# Altium integrated library Wurth Electronik Pin Headers 6130xx21121.IntLib: 130 symbols (part 2 of 2)
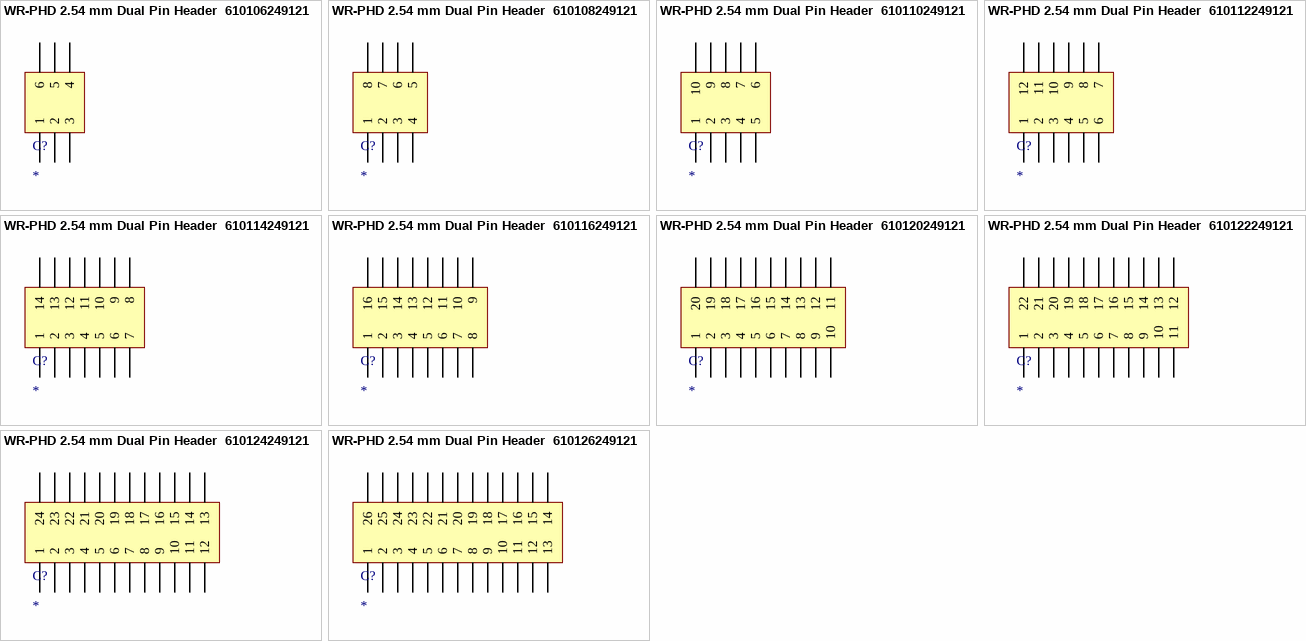
[diagram p14: symbols WR-PHD 2.54 mm Dual Pin Header  610106249121 to WR-PHD 2.54 mm Dual Pin Header  610126249121]

## WR-PHD 2.54 mm Dual Pin Header  610124249121
designator C?
WR-PHD 2.54 mm Dual Pin Header; Manufacturer: Würth Elektronik eiSos GmbH; partNo: 610124249121; ComponentLink1 Description: Manufacturer; ComponentLink2 Description: Datasheet; NoPins: 24; ComponentLink1URL: http://www.we-online.de; ComponentLink2URL: http://katalog.we-online.de/em/datasheet/6101xx249121.pdf; Created by: Karrer Zheng; Created Date: 10/9/2014
footprint 610124249121
pins: 1, 2, 3, 4, 5, 6, 7, 8, 9, 10, 11, 12, 13, 14, 15, 16, 17, 18, 19, 20, 21, 22, 23, 24

## WR-PHD 2.54 mm Dual Pin Header  610126249121
designator C?
WR-PHD 2.54 mm Dual Pin Header; Manufacturer: Würth Elektronik eiSos GmbH; partNo: 610126249121; ComponentLink1 Description: Manufacturer; ComponentLink2 Description: Datasheet; NoPins: 26; ComponentLink1URL: http://www.we-online.de; ComponentLink2URL: http://katalog.we-online.de/em/datasheet/6101xx249121.pdf; Created by: Karrer Zheng; Created Date: 10/9/2014
footprint 610126249121
pins: 1, 2, 3, 4, 5, 6, 7, 8, 9, 10, 11, 12, 13, 14, 15, 16, 17, 18, 19, 20, 21, 22, 23, 24, 25, 26